# Altium schematic symbol library lib_datalogger.SchLib: 1246 symbols (part 2 of 16) (continued)
## CMP-002-00044-2 (continued)
SIM Card Socket, 50 V, 0.5 A, 9-Pin SMD, Halogen Free; Manufacturer: LCN; Current: 0.5A; Gender: Female; Voltage: 50V; Pins: 9; Datasheet URL: http://www.linkconn.com/Content/Linkconn/Uploads/file/20140308/CAF98-06206-S100-cus-G.pdf; Datasheet Version: Rev. G, 06/2013; Mounting Technology: SM; Case/Package: CAF98-06206-S100; Manufacturer URL: http://www.linkconn.com/index; Halogen Compliant: True; Connector Type: Socket; Package Reference: CAF98-06206-S100; Package Description: 9-Pin Surface Mount Device, Body 19.1 x 26.6 mm
footprint LCN-CAF98-06206-S100_V (SMD, 9-Leads, Body 26.6x19.1mm)
pins: 1 I/O (io), 2 CLK (in), 3 VPP (power), 4 RST (in), 5 GND (power), 6 VCC (power), 7 CD (out), 8 GND (power), 9 GND (power)

## CMP-002-00045-2
designator J?, comment 734120110
Microcoaxial RF, 60 V, 50 Ohm, -40 to 90 degC, 4-Pin SMD, RoHS, Tape and Reel; Manufacturer: Molex; Voltage: 60V; Connector Type: RF&Coax; Gender: Male; Case/Package: 0734120110; Max Operating Temperature: 90°C; Package Reference: 734120110; Pins: 4; Datasheet URL: http://www.molex.com/pdm_docs/sd/734120110_sd.pdf; RoHS Compliant: True; Datasheet Version: 42186; Mounting Technology: SM; Packaging: TapeandReel; Min Operating Temperature: -40°C; Manufacturer URL: http://www.molex.com/; Package Description: 4-Pin Surface Mount Device, Body 2.6 x 2.6 mm
footprint MOLX-73412-0110_V (MCRF, 4-Leads, Body 2.6x2.6mm)
pins: 1, 2, 3, 4

## CMP-002-00046-2
designator P?, comment MW-10-03-G-D-245-065-P
Flexible Micro Board Stacker, Pitch 1 mm, 2 x 10 Position, Height 9.4 mm, -55 to 125 degC, RoHS, Tape and Reel; Manufacturer: Samtec; Connector Type: Header; Gender: Male; Min Operating Temperature: -55°C; Pins: 20; Datasheet URL: http://suddendocs.samtec.com/prints/mw-xx-03-x-d-xxx-xxx-xx-mkt.pdf; Package Reference: MW-10-03-G-D-245-065-P; Case/Package: MW-10-03-G-D-245-065-P; Package Description: Flexible Micro Board Stacker, Pitch 1 mm, 2 x 10 Position, Height 9.4 mm; Packaging: TapeandReel; Max Operating Temperature: 125°C; RoHS Compliant: True; Datasheet Version: 34759; Manufacturer URL: https://www.samtec.com/; Mounting Technology: SM
footprint SMTC-MW-10-03-G-D-245-065-P_V (CONN, 20-Leads, Body 3.18x10mm, Pitch 1mm)
pins: 1, 2, 3, 4, 5, 6, 7, 8, 9, 10, 11, 12, 13, 14, 15, 16, 17, 18, 19, 20

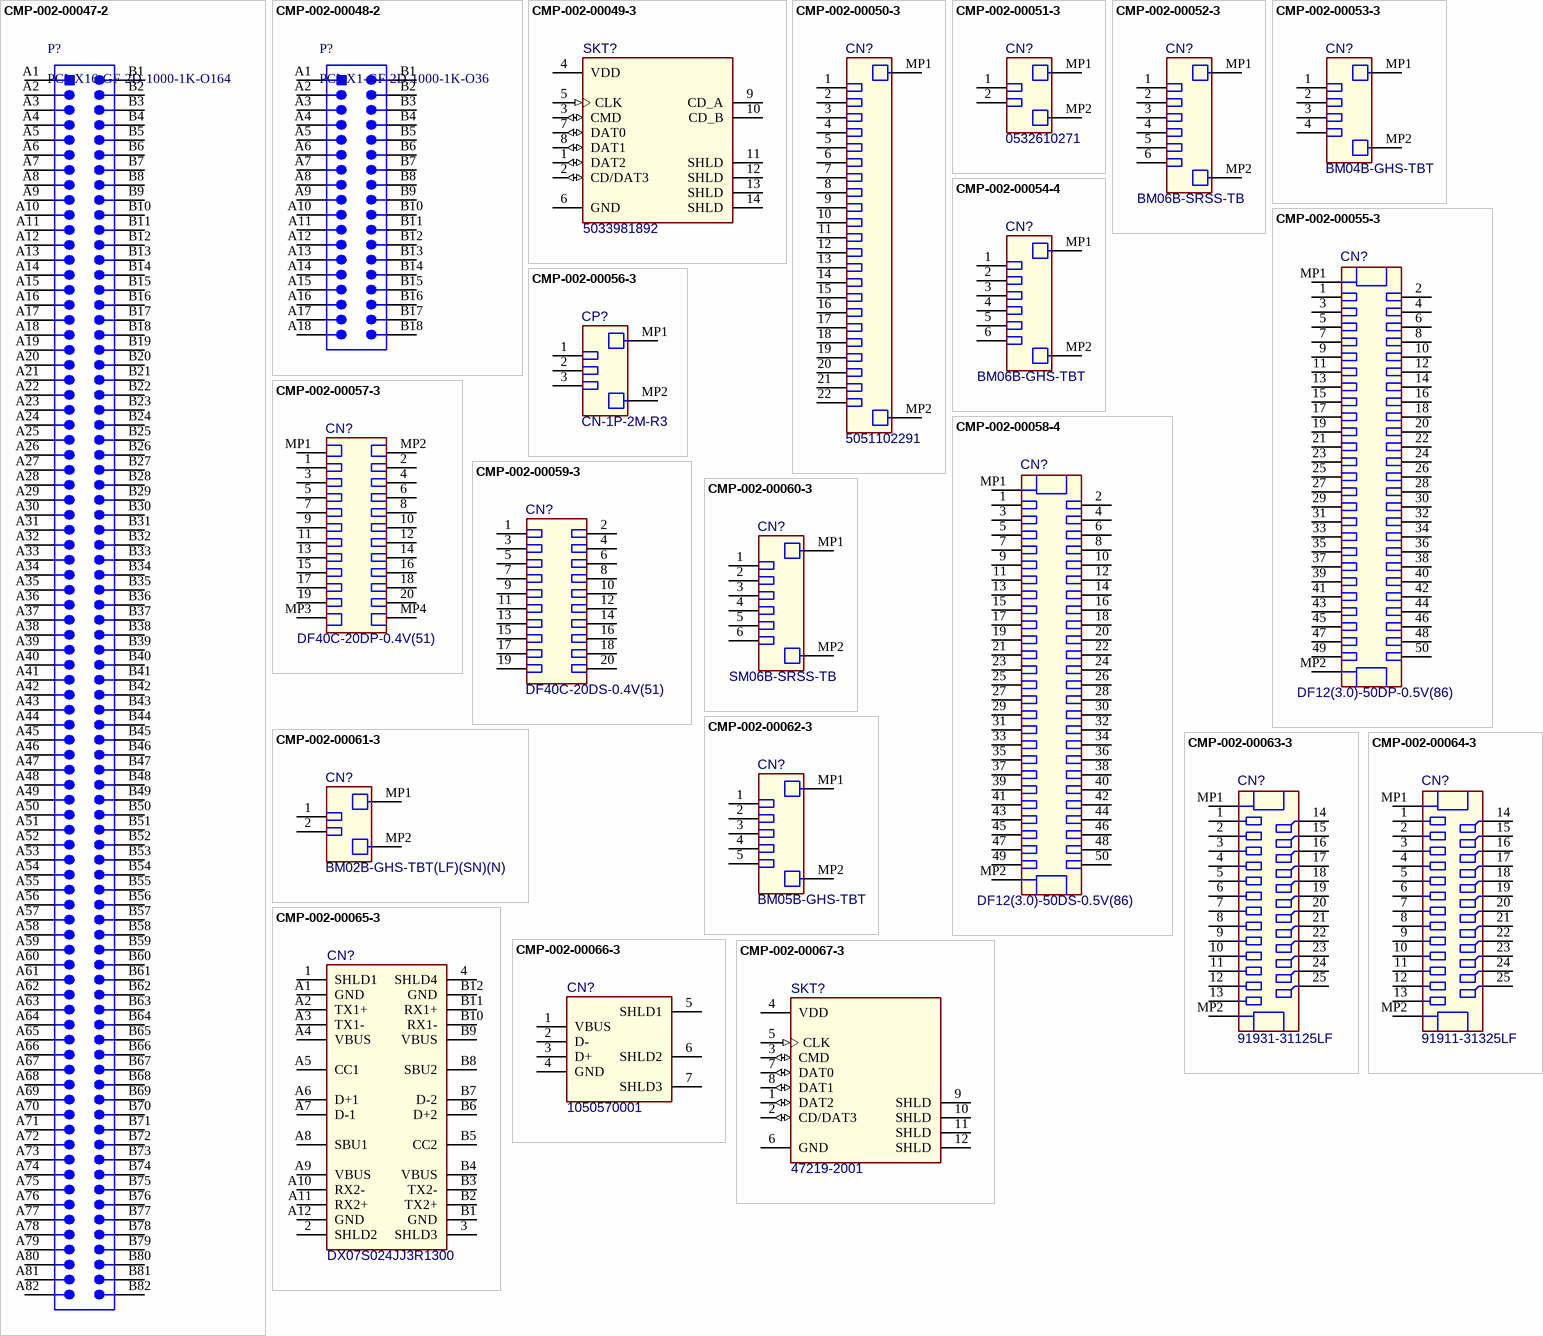
[diagram p5: symbols CMP-002-00047-2 to CMP-002-00067-3]

## CMP-002-00047-2
designator P?, comment PCIeX16-GF-2D-1000-1K-O164
Golden Finger, PCIeX16, Dual, Opposite, Pitch 1mm, 164-Position; Connector Type: EdgeConnector; Gender: Male; Package Reference: PCIeX16-GF-2D-1000-1K-O164; Package Description: Edge Connector, Golden Finger, Pitch 1 mm, 2 x 82 Position; Mounting Technology: SM; Case/Package: PCIeX16-GF-2D-1000-1K-O164; Pins: 164
footprint PCIeX16-GF-2D-1000-1K-O164 (Golden finger, PCIeX16, Dual, Opposite, Pitch 1mm, 164-Position)
pins: A1, A2, A3, A4, A5, A6, A7, A8, A9, A10, A11, A12, A13, A14, A15, A16, A17, A18, A19, A20, A21, A22, A23, A24, A25, A26, A27, A28, A29, A30, A31, A32, A33, A34, A35, A36, A37, A38, A39, A40, A41, A42, A43, A44, A45, A46, A47, A48, A49, A50, A51, A52, A53, A54, A55, A56, A57, A58, A59, A60, A61, A62, A63, A64, A65, A66, A67, A68, A69, A70, A71, A72, A73, A74, A75, A76, A77, A78, A79, A80, A81, A82, B1, B2, B3, B4, B5, B6, B7, B8, B9, B10, B11, B12, B13, B14, B15, B16, B17, B18, B19, B20, B21, B22, B23, B24, B25, B26, B27, B28, B29, B30, B31, B32, B33, B34, B35, B36, B37, B38, B39, B40, B41, B42, B43, B44, B45, B46, B47, B48, B49, B50, B51, B52, B53, B54, B55, B56, B57, B58, B59, B60, B61, B62, B63, B64, B65, B66, B67, B68, B69, B70, B71, B72, B73, B74, B75, B76, B77, B78, B79, B80, B81, B82

## CMP-002-00048-2
designator P?, comment PCIeX1-GF-2D-1000-1K-O36
Golden Finger, PCIeX1, Dual, Opposite, Pitch 1mm, 36-Position; Gender: Male; Connector Type: EdgeConnector; Package Description: Edge Connector, Golden Finger, Pitch 1 mm, 2 x 18 Position; Case/Package: PCIeX1-GF-2D-1000-1K-O36; Pins: 36; Mounting Technology: SM; Package Reference: PCIeX1-GF-2D-1000-1K-O36
footprint PCIeX1-GF-2D-1000-1K-O36 (Golden finger, PCIeX1, Dual, Opposite, Pitch 1mm, 36-Position)
pins: A1, A2, A3, A4, A5, A6, A7, A8, A9, A10, A11, A12, A13, A14, A15, A16, A17, A18, B1, B2, B3, B4, B5, B6, B7, B8, B9, B10, B11, B12, B13, B14, B15, B16, B17, B18

## CMP-002-00049-3
designator SKT?, comment 5033981892
Micro SD Card Connector, Pitch 1.1 mm, 8 Position, Height 1.4 mm, -25 to 85 degC, RoHS, Tape and Reel; Pins: 14
footprint MOLX-5033981892_V (CONN, 8-Leads, Body 14.05x13.2mm, Pitch 1.1mm)
footprint MOLX-5033981892_V (CONN, 8-Leads, Body 14.05x13.2mm, Pitch 1.1mm)
pins: 1 DAT2 (io), 2 CD/DAT3 (io), 3 CMD (io), 4 VDD (power), 5 CLK (in), 6 GND, 7 DAT0 (io), 8 DAT1 (io), 9 CD_A, 10 CD_B, 11 SHLD, 12 SHLD, 13 SHLD, 14 SHLD

## CMP-002-00050-3
designator CN?, comment 5051102291
Right Angle FFC/FPC Connector, 50 V, 0.5 A, -40 to 105 degC, RoHS, Tape and Reel; Pins: 24
footprint MOLX-5051102291_V (SMD, 22-Leads, Body 5.3x16.5mm, Pitch 0.5mm)
footprint MOLX-5051102291_V (SMD, 22-Leads, Body 5.3x16.5mm, Pitch 0.5mm)
pins: 1, 2, 3, 4, 5, 6, 7, 8, 9, 10, 11, 12, 13, 14, 15, 16, 17, 18, 19, 20, 21, 22, MP1, MP2

## CMP-002-00051-3
designator CN?, comment 0532610271
Header, Pitch 1.25 mm, 1 x 2 Position, Height 3.6 mm, -40 to 85 degC; Connector Type: WiretoBoard; Gender: HDR; Pins: 4
footprint JST-BM02B-GHS-TBT_V (Connector, 2-Leads, Body 5.75x4.25mm, Pitch 1.25mm)
footprint MOLX-532610271_V (SMD, 2-Leads, Body 7.65x4.2mm, Pitch 1.25mm)
pins: 1, 2, MP1, MP2

## CMP-002-00052-3
designator CN?, comment BM06B-SRSS-TB
Header, Pitch 1 mm, 1 x 6 Position, Height 4.25 mm, -25 to 85 degC; Connector Type: Header,Shrouded; Pins: 8
footprint JST-SM06B-SRSS-TB_V (SMD, 6-Leads, Body 8x4.25mm, Pitch 1mm)
footprint JST-BM06B-SRSS-TB_V (SMD, 6-Leads, Body 2.9x8mm, Pitch 1mm)
pins: 1, 2, 3, 4, 5, 6, MP1, MP2

## CMP-002-00053-3
designator CN?, comment BM04B-GHS-TBT
Header, Pitch 1.25 mm, 1 x 4 Position, Height 4.05 mm, -25 to 85 degC; Pins: 6
footprint JST-BM04B-GHS-TBT_V (Connector, 4-Leads, Body 8.25x4.25mm, Pitch 1.25mm)
footprint JST-BM04B-GHS-TBT_V (Connector, 4-Leads, Body 8.25x4.25mm, Pitch 1.25mm)
pins: 1, 2, 3, 4, MP1, MP2

## CMP-002-00054-4
designator CN?, comment BM06B-GHS-TBT
Header, Pitch 1.25 mm, 1 x 6 Position, Height 4.05 mm, -25 to 85 degC; Pins: 8
footprint JST-SM06B-SRSS-TB_V (SMD, 6-Leads, Body 8x4.25mm, Pitch 1mm)
footprint JST-BM06B-GHS-TBT_V (Connector, 6-Leads, Body 10.75x4.25mm, Pitch 1.25mm)
pins: 1, 2, 3, 4, 5, 6, MP1, MP2

## CMP-002-00055-3
designator CN?, comment DF12(3.0)-50DP-0.5V(86)
Plug Connector, 50 V, 0.3 A, -45 to 125 degC, RoHS, Tape and Reel; Pins: 52
footprint HIRO-DF12(3.0)-50DS-0.5V_V (SMD, 50-Leads, Body 14.6x3.6mm, Pitch 0.5mm)
footprint HIRO-DF12(3.0)-50DP-0.5V_V (SMD, 50-Leads, Body 14.7x3.8mm, Pitch 0.5mm)
pins: 1, 2, 3, 4, 5, 6, 7, 8, 9, 10, 11, 12, 13, 14, 15, 16, 17, 18, 19, 20, 21, 22, 23, 24, 25, 26, 27, 28, 29, 30, 31, 32, 33, 34, 35, 36, 37, 38, 39, 40, 41, 42, 43, 44, 45, 46, 47, 48, 49, 50, MP1, MP2

## CMP-002-00056-3
designator CP?, comment CN-1P-2M-R3
AMASS 500V 15A   0.8 mOhm; Pins: 5
footprint MR30PW-FB-Footprint-1
footprint MR30PW-FB-Footprint-1
pins: 1, 2, 3, MP1, MP2

## CMP-002-00057-3
designator CN?, comment DF40C-20DP-0.4V(51)
Plug Connector, 30 V, 0.3 A, -35 to 85 degC, RoHS, Tape and Reel; Pins: 24
footprint HIRO-DF40C-20DP-0.4V(51)_V (CONN, 20-Lead, Body 5.52x1.85mm, Pitch 0.4mm)
footprint HIRO-DF40C-20DP-0.4V(51)_V (CONN, 20-Lead, Body 5.52x1.85mm, Pitch 0.4mm)
pins: 1, 2, 3, 4, 5, 6, 7, 8, 9, 10, 11, 12, 13, 14, 15, 16, 17, 18, 19, 20, MP1 MP, MP2 MP, MP3 MP, MP4 MP

## CMP-002-00058-4
designator CN?, comment DF12(3.0)-50DS-0.5V(86)
Receptacle Connector, 50 V, 0.3 A, -45 to 125 degC, RoHS, Tape and Reel; Pins: 52
footprint HIRO-DF12(3.0)-50DS-0.5V_V (SMD, 50-Leads, Body 14.6x3.6mm, Pitch 0.5mm)
footprint HIRO-DF12(3.0)-50DS-0.5V_V (SMD, 50-Leads, Body 14.6x3.6mm, Pitch 0.5mm)
pins: 1, 2, 3, 4, 5, 6, 7, 8, 9, 10, 11, 12, 13, 14, 15, 16, 17, 18, 19, 20, 21, 22, 23, 24, 25, 26, 27, 28, 29, 30, 31, 32, 33, 34, 35, 36, 37, 38, 39, 40, 41, 42, 43, 44, 45, 46, 47, 48, 49, 50, MP1, MP2

## CMP-002-00059-3
designator CN?, comment DF40C-20DS-0.4V(51)
Receptacle Connector, 30 V, 0.3 A, -35 to 85 degC, RoHS, Tape and Reel; Connector Type: Receptacle,CenterStripContacts; Pins: 20
footprint HIRO-DF40C-20DS-0.4V(51)_V (CONN, 20-Lead, Body 6.6x2.88mm, Pitch 0.4mm)
footprint HIRO-DF40C-20DS-0.4V(51)_V (CONN, 20-Lead, Body 6.6x2.88mm, Pitch 0.4mm)
pins: 1, 2, 3, 4, 5, 6, 7, 8, 9, 10, 11, 12, 13, 14, 15, 16, 17, 18, 19, 20

## CMP-002-00060-3
designator CN?, comment SM06B-SRSS-TB
Male Header, Pitch 1 mm, 1 x 6 Position, Height 2.95 mm, -25 to 85 degC, RoHS, Tape and Reel; Pins: 8; Case/Package: Male Header, Pitch 1 mm, 1 X 6 Position, Height 2.9 mm; Mounting Technology: SurfaceMount
footprint JST-SM06B-SRSS-TB_V (SMD, 6-Leads, Body 8x4.25mm, Pitch 1mm)
footprint JST-SM06B-SRSS-TB_V (SMD, 6-Leads, Body 8x4.25mm, Pitch 1mm)
pins: 1, 2, 3, 4, 5, 6, MP1, MP2

## CMP-002-00061-3
designator CN?, comment BM02B-GHS-TBT(LF)(SN)(N)
Disconnectable Crimp Style Connector, Pitch 1.25 mm, 1 x 2 Position, Height 4.05 mm, -25 to 85 degC, RoHS, Tape and Reel; Connector Type: Header,Shrouded; Mounting Technology: SurfaceMount; Case/Package: Disconnectable Crimp Style Connector, Pitch 1.25 mm, 1 x 2 Position, Height 4.05 mm; Pins: 4
footprint JST-BM02B-GHS-TBT_V (Connector, 2-Leads, Body 5.75x4.25mm, Pitch 1.25mm)
footprint JST-BM02B-GHS-TBT_V (Connector, 2-Leads, Body 5.75x4.25mm, Pitch 1.25mm)
pins: 1, 2, MP1, MP2

## CMP-002-00062-3
designator CN?, comment BM05B-GHS-TBT
GH Disconnectable Crimp Style Connector, Pitch 1.25 mm, 1 x 5 Position, Height 4.05 mm, -25 to 85 degC, RoHS, Tape and Reel; Mounting Technology: SurfaceMount; Pins: 7; Case/Package: GH Disconnectable Crimp Style Connector, Pitch 1.25 mm, 1 x 5 Position, Height 4.05 mm
footprint JST-BM05B-GHS-TBT_V (Connector, 5-Leads, Body 9.5x4.25mm, Pitch 1.25mm)
footprint JST-BM05B-GHS-TBT_V (Connector, 5-Leads, Body 9.5x4.25mm, Pitch 1.25mm)
pins: 1, 2, 3, 4, 5, MP1, MP2

## CMP-002-00063-3
designator CN?, comment 91931-31125LF
Receptacle, Pitch 1 mm, 25 Position, Height 4.15 mm, -55 to 130 degC; Pins: 27
footprint AMPH-91911-31325_V (SMD, 25-Leads, Body 5.59x17.3mm, Pitch 1mm)
footprint AMPH-91931-31125_V (SMD, 25-Leads, Body 5.59x17.3mm, Pitch 1mm)
pins: 1, 2, 3, 4, 5, 6, 7, 8, 9, 10, 11, 12, 13, 14, 15, 16, 17, 18, 19, 20, 21, 22, 23, 24, 25, MP1, MP2

## CMP-002-00064-3
designator CN?, comment 91911-31325LF
Header, Pitch 1 mm, 25 Position, Height 5 mm, -55 to 130 degC; Pins: 27
footprint AMPH-91911-31325_V (SMD, 25-Leads, Body 5.59x17.3mm, Pitch 1mm)
footprint AMPH-91911-31325_V (SMD, 25-Leads, Body 5.59x17.3mm, Pitch 1mm)
pins: 1, 2, 3, 4, 5, 6, 7, 8, 9, 10, 11, 12, 13, 14, 15, 16, 17, 18, 19, 20, 21, 22, 23, 24, 25, MP1, MP2

## CMP-002-00065-3
designator CN?, comment DX07S024JJ3R1300
USB-C Connector, 20 V, 1.25 A, -30 to 80 degC, RoHS, Tape and Reel; Gender: Receptacle; Pins: 28; Connector Type: USB-C
footprint JAE-DX07S024JJ3_V (THD, 24-Leads, Body 8.17x8.94mm, Pitch 0.5mm)
footprint JAE-DX07S024JJ3_V (THD, 24-Leads, Body 8.17x8.94mm, Pitch 0.5mm)
pins: 1 SHLD1, 2 SHLD2, 3 SHLD3, 4 SHLD4, A1 GND, A2 TX1+, A3 TX1-, A4 VBUS, A5 CC1, A6 D+1, A7 D-1, A8 SBU1, A9 VBUS, A10 RX2-, A11 RX2+, A12 GND, B1 GND, B2 TX2+, B3 TX2-, B4 VBUS, B5 CC2, B6 D+2, B7 D-2, B8 SBU2, B9 VBUS, B10 RX1-, B11 RX1+, B12 GND

## CMP-002-00066-3
designator CN?, comment 1050570001
USB-A Connector, 30 V, 1.5 A, -40 to 85 degC, RoHS, Tape and Reel; Gender: RCP; Pins: 7; RoHS Compliant: Yes
footprint MOLX-1050570001_V (THD, 4-Leads, Body 14.63x7.25mm)
footprint MOLX-1050570001_V (THD, 4-Leads, Body 14.63x7.25mm)
pins: 1 VBUS, 2 D-, 3 D+, 4 GND, 5 SHLD1, 6 SHLD2, 7 SHLD3

## CMP-002-00067-3
designator SKT?, comment 47219-2001
MicroSD Card Connector, Hinge Type, -40 to 85 degC, 8-Pin SMD, RoHS, Tape and Reel; RoHS Compliant: Details; Pins: 12
footprint MOLX-47219-2001-8_V (CONN, 8-Leads, Body 14.5x13.6mm, Pitch 1.1mm)
footprint MOLX-47219-2001-8_V (CONN, 8-Leads, Body 14.5x13.6mm, Pitch 1.1mm)
pins: 1 DAT2 (io), 2 CD/DAT3 (io), 3 CMD (io), 4 VDD (power), 5 CLK (in), 6 GND, 7 DAT0 (io), 8 DAT1 (io), 9 SHLD, 10 SHLD, 11 SHLD, 12 SHLD

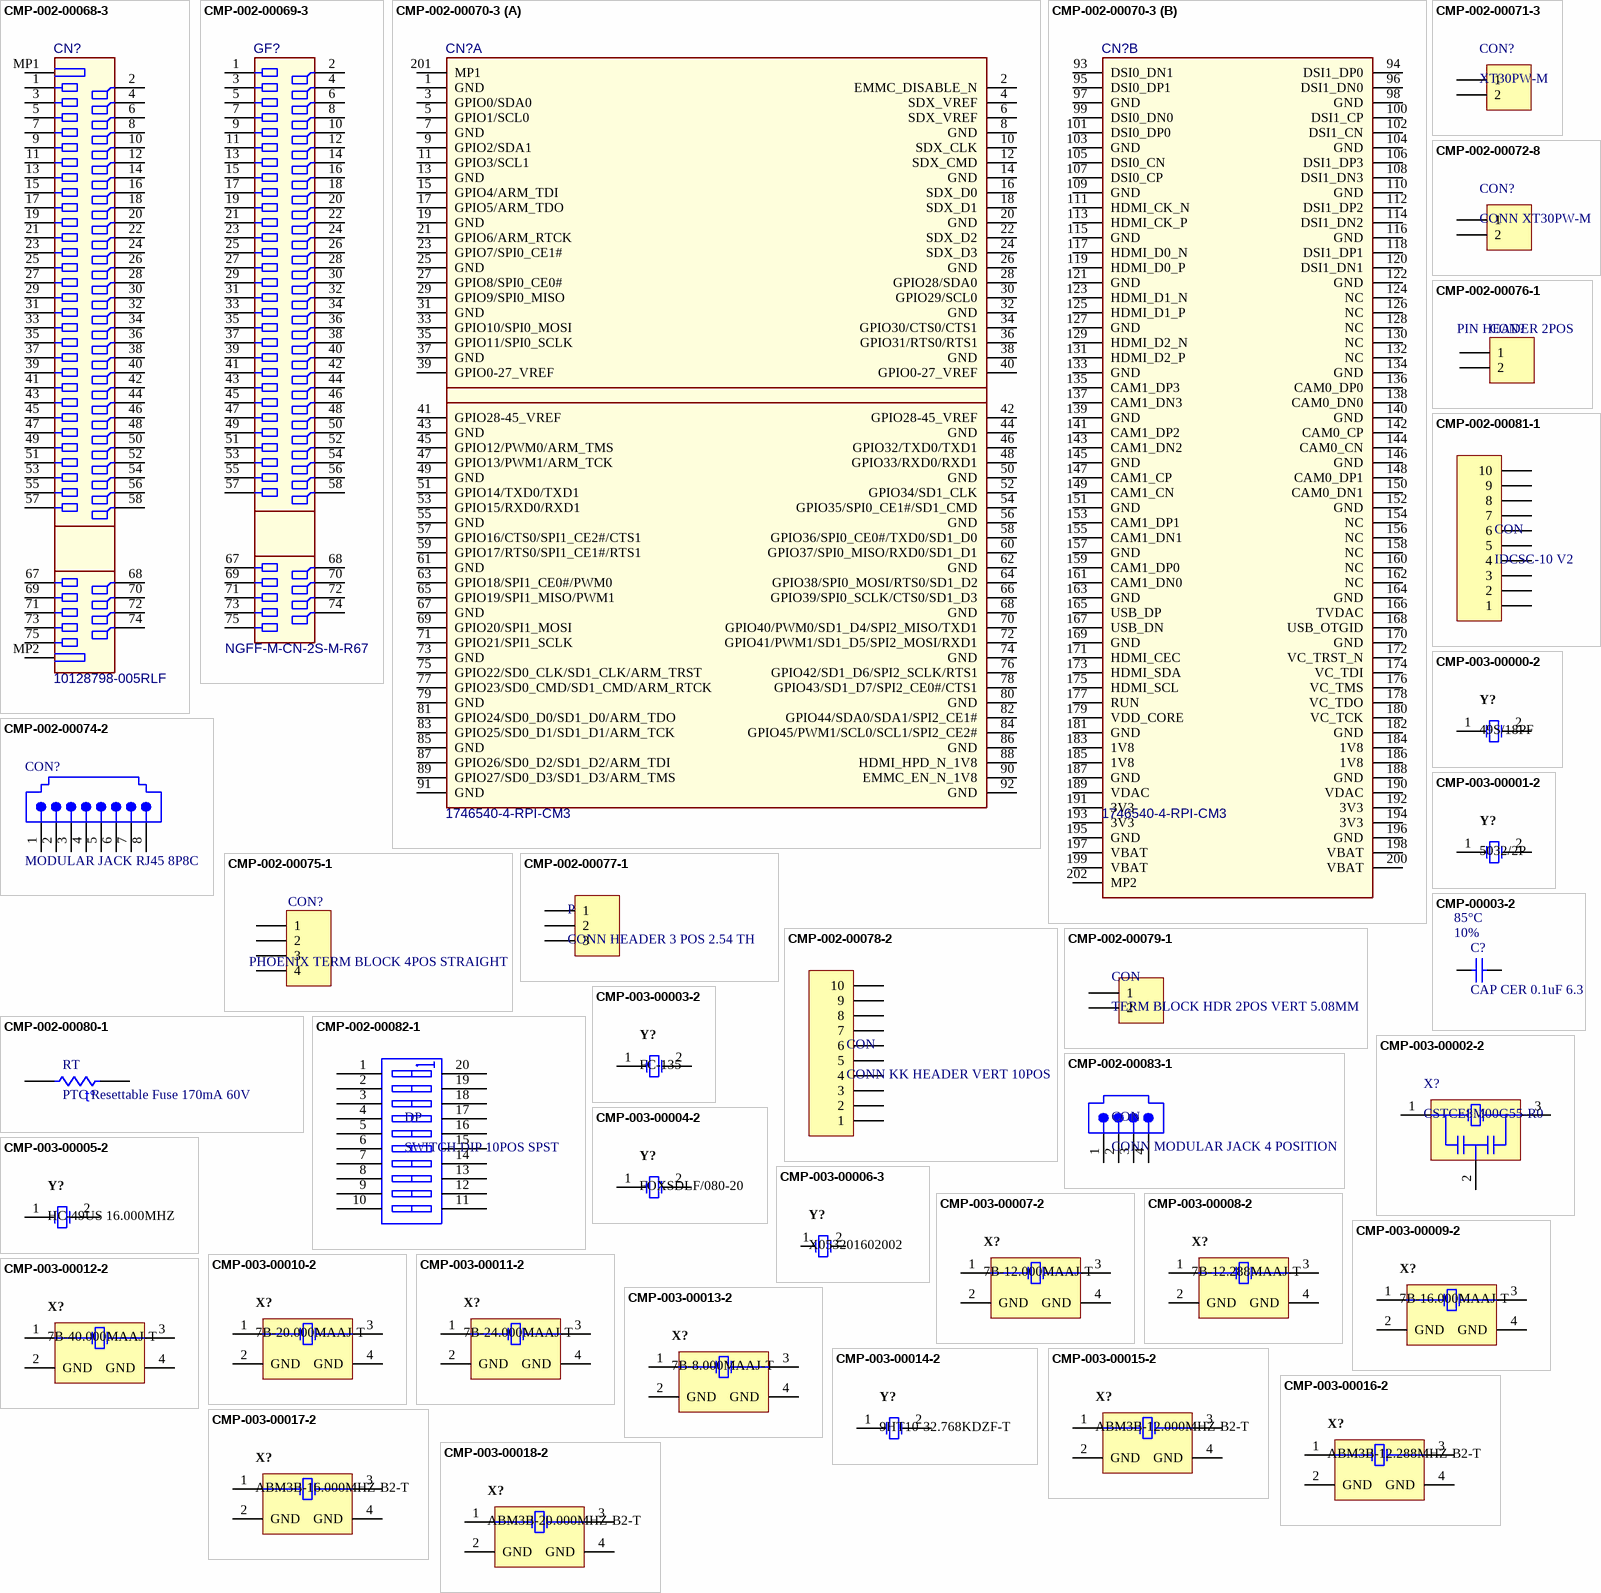
[diagram p6: symbols CMP-002-00068-3 to CMP-003-00018-2]

## CMP-002-00068-3
designator CN?, comment 10128798-005RLF
Card Edge Connector, Pitch 0.5 mm, 67 Position, Height 5.8 mm; Pins: 69
footprint AMPH-10128798-005RLF_V (SMD, 67-Leads, Body 21.9x7.2mm, Pitch 0.5mm)
footprint AMPH-10128798-005RLF_V (SMD, 67-Leads, Body 21.9x7.2mm, Pitch 0.5mm)
pins: 1, 2, 3, 4, 5, 6, 7, 8, 9, 10, 11, 12, 13, 14, 15, 16, 17, 18, 19, 20, 21, 22, 23, 24, 25, 26, 27, 28, 29, 30, 31, 32, 33, 34, 35, 36, 37, 38, 39, 40, 41, 42, 43, 44, 45, 46, 47, 48, 49, 50, 51, 52, 53, 54, 55, 56, 57, 58, 67, 68, 69, 70, 71, 72, 73, 74, 75, MP1, MP2

## CMP-002-00069-3
designator GF?, comment NGFF-M-CN-2S-M-R67  (no BOM)
Golden finger, NGFF key M, Dual, Staggered, Pitch 0.5mm, 67-Position; Pins: 67
footprint NGFF-M-GF-2D-500-1K-S67 (Golden finger, NGFF key M, Dual, Staggered, Pitch 0.5mm, 47-Position)
footprint NGFF-M-GF-2D-500-1K-S67 (Golden finger, NGFF key M, Dual, Staggered, Pitch 0.5mm, 47-Position)
pins: 1, 2, 3, 4, 5, 6, 7, 8, 9, 10, 11, 12, 13, 14, 15, 16, 17, 18, 19, 20, 21, 22, 23, 24, 25, 26, 27, 28, 29, 30, 31, 32, 33, 34, 35, 36, 37, 38, 39, 40, 41, 42, 43, 44, 45, 46, 47, 48, 49, 50, 51, 52, 53, 54, 55, 56, 57, 58, 67, 68, 69, 70, 71, 72, 73, 74, 75

## CMP-002-00070-3
designator CN?, comment 1746540-4-RPI-CM3
Raspberry Pi Compute Module 3 socket; Pins: 202
footprint TECO-1746540-4_V (SMD, 200-Leads, Body 71.5x26.55mm, Pitch 0.6mm)
footprint TECO-1746540-4_V (SMD, 200-Leads, Body 71.5x26.55mm, Pitch 0.6mm)
part A pins: 1 GND, 2 EMMC_DISABLE_N, 3 GPIO0/SDA0, 4 SDX_VREF, 5 GPIO1/SCL0, 6 SDX_VREF, 7 GND, 8 GND, 9 GPIO2/SDA1, 10 SDX_CLK, 11 GPIO3/SCL1, 12 SDX_CMD, 13 GND, 14 GND, 15 GPIO4/ARM_TDI, 16 SDX_D0, 17 GPIO5/ARM_TDO, 18 SDX_D1, 19 GND, 20 GND, 21 GPIO6/ARM_RTCK, 22 SDX_D2, 23 GPIO7/SPI0_CE1#, 24 SDX_D3, 25 GND, 26 GND, 27 GPIO8/SPI0_CE0#, 28 GPIO28/SDA0, 29 GPIO9/SPI0_MISO, 30 GPIO29/SCL0, 31 GND, 32 GND, 33 GPIO10/SPI0_MOSI, 34 GPIO30/CTS0/CTS1, 35 GPIO11/SPI0_SCLK, 36 GPIO31/RTS0/RTS1, 37 GND, 38 GND, 39 GPIO0-27_VREF, 40 GPIO0-27_VREF, 41 GPIO28-45_VREF, 42 GPIO28-45_VREF, 43 GND, 44 GND, 45 GPIO12/PWM0/ARM_TMS, 46 GPIO32/TXD0/TXD1, 47 GPIO13/PWM1/ARM_TCK, 48 GPIO33/RXD0/RXD1, 49 GND, 50 GND, 51 GPIO14/TXD0/TXD1, 52 GPIO34/SD1_CLK, 53 GPIO15/RXD0/RXD1, 54 GPIO35/SPI0_CE1#/SD1_CMD, 55 GND, 56 GND, 57 GPIO16/CTS0/SPI1_CE2#/CTS1, 58 GPIO36/SPI0_CE0#/TXD0/SD1_D0, 59 GPIO17/RTS0/SPI1_CE1#/RTS1, 60 GPIO37/SPI0_MISO/RXD0/SD1_D1, 61 GND, 62 GND, 63 GPIO18/SPI1_CE0#/PWM0, 64 GPIO38/SPI0_MOSI/RTS0/SD1_D2, 65 GPIO19/SPI1_MISO/PWM1, 66 GPIO39/SPI0_SCLK/CTS0/SD1_D3, 67 GND, 68 GND, 69 GPIO20/SPI1_MOSI, 70 GPIO40/PWM0/SD1_D4/SPI2_MISO/TXD1, 71 GPIO21/SPI1_SCLK, 72 GPIO41/PWM1/SD1_D5/SPI2_MOSI/RXD1, 73 GND, 74 GND, 75 GPIO22/SD0_CLK/SD1_CLK/ARM_TRST, 76 GPIO42/SD1_D6/SPI2_SCLK/RTS1, 77 GPIO23/SD0_CMD/SD1_CMD/ARM_RTCK, 78 GPIO43/SD1_D7/SPI2_CE0#/CTS1, 79 GND, 80 GND, 81 GPIO24/SD0_D0/SD1_D0/ARM_TDO, 82 GPIO44/SDA0/SDA1/SPI2_CE1#, 83 GPIO25/SD0_D1/SD1_D1/ARM_TCK, 84 GPIO45/PWM1/SCL0/SCL1/SPI2_CE2#, 85 GND, 86 GND, 87 GPIO26/SD0_D2/SD1_D2/ARM_TDI, 88 HDMI_HPD_N_1V8, 89 GPIO27/SD0_D3/SD1_D3/ARM_TMS, 90 EMMC_EN_N_1V8, 91 GND, 92 GND, 201 MP1
part B pins: 93 DSI0_DN1, 94 DSI1_DP0, 95 DSI0_DP1, 96 DSI1_DN0, 97 GND, 98 GND, 99 DSI0_DN0, 100 DSI1_CP, 101 DSI0_DP0, 102 DSI1_CN, 103 GND, 104 GND, 105 DSI0_CN, 106 DSI1_DP3, 107 DSI0_CP, 108 DSI1_DN3, 109 GND, 110 GND, 111 HDMI_CK_N, 112 DSI1_DP2, 113 HDMI_CK_P, 114 DSI1_DN2, 115 GND, 116 GND, 117 HDMI_D0_N, 118 DSI1_DP1, 119 HDMI_D0_P, 120 DSI1_DN1, 121 GND, 122 GND, 123 HDMI_D1_N, 124 NC, 125 HDMI_D1_P, 126 NC, 127 GND, 128 NC, 129 HDMI_D2_N, 130 NC, 131 HDMI_D2_P, 132 NC, 133 GND, 134 GND, 135 CAM1_DP3, 136 CAM0_DP0, 137 CAM1_DN3, 138 CAM0_DN0, 139 GND, 140 GND, 141 CAM1_DP2, 142 CAM0_CP, 143 CAM1_DN2, 144 CAM0_CN, 145 GND, 146 GND, 147 CAM1_CP, 148 CAM0_DP1, 149 CAM1_CN, 150 CAM0_DN1, 151 GND, 152 GND, 153 CAM1_DP1, 154 NC, 155 CAM1_DN1, 156 NC, 157 GND, 158 NC, 159 CAM1_DP0, 160 NC, 161 CAM1_DN0, 162 NC, 163 GND, 164 GND, 165 USB_DP, 166 TVDAC, 167 USB_DN, 168 USB_OTGID, 169 GND, 170 GND, 171 HDMI_CEC, 172 VC_TRST_N, 173 HDMI_SDA, 174 VC_TDI, 175 HDMI_SCL, 176 VC_TMS, 177 RUN, 178 VC_TDO, 179 VDD_CORE, 180 VC_TCK, 181 GND, 182 GND, 183 1V8 (power), 184 1V8, 185 1V8, 186 1V8, 187 GND, 188 GND, 189 VDAC, 190 VDAC, 191 3V3, 192 3V3, 193 3V3, 194 3V3, 195 GND, 196 GND, 197 VBAT, 198 VBAT, 199 VBAT, 200 VBAT, 202 MP2